# Altium footprint library 13-Pcblib_MCU.PcbLib: 48 footprints (part 2 of 3)
Each footprint in its own frame and in the unit in brackets; x right, y up, seen from the top. Pads: shape width x height; smd on the part's side, far side on the other; paste and mask are expansions set on the pad; w line width, h text height; cw(c..) or ccw(c..) is an arc to the next point about the centre after c.
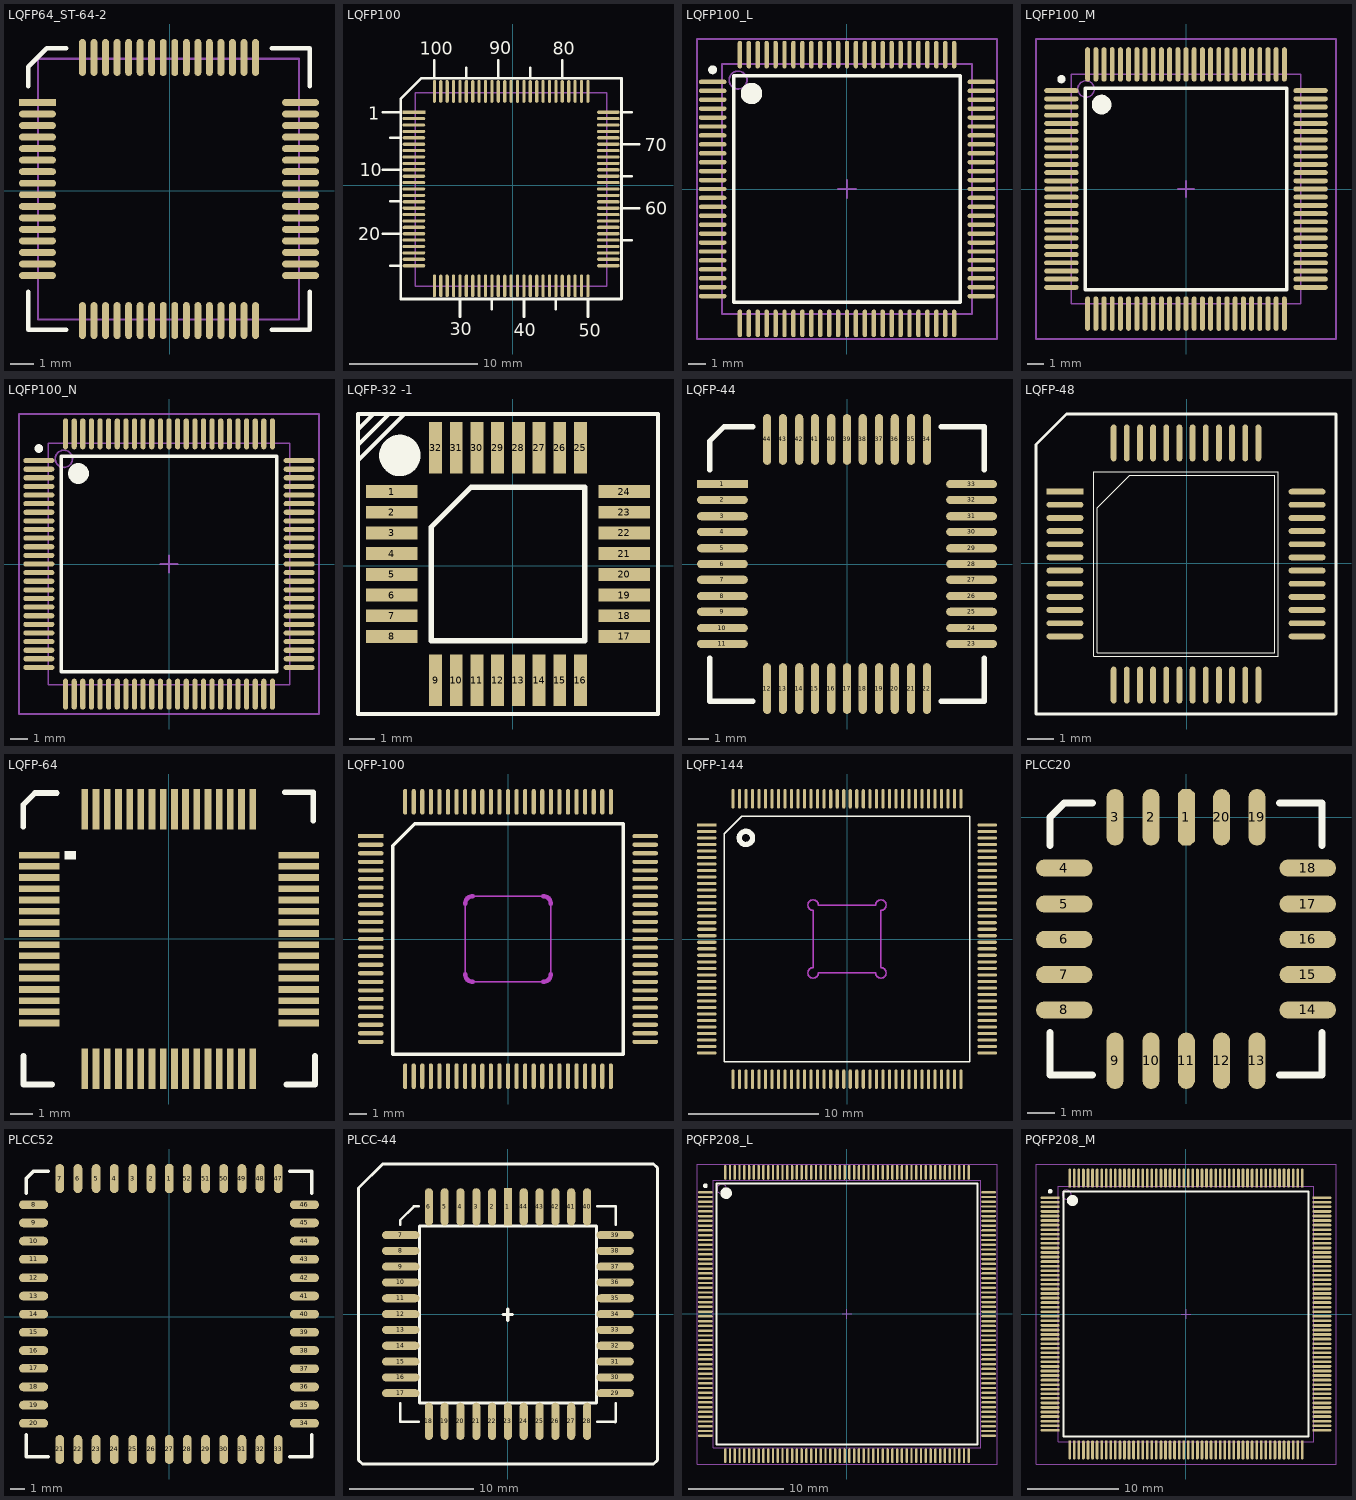
[diagram p1: the footprints below, top view; thin cyan lines are the x and y axes]

## LQFP64_ST-64-2 [mm]
height 1.2
pads (64):
  rect 1.6x0.3 smd: 1(-5.742,3.82)
  oval 1.6x0.3 smd: 2(-5.742,3.32) 3(-5.742,2.82) 4(-5.742,2.32) 5(-5.742,1.82) 6(-5.742,1.32) 7(-5.742,0.82) 8(-5.742,0.32) 9(-5.742,-0.18) 10(-5.742,-0.68) 11(-5.742,-1.18) 12(-5.742,-1.68) 13(-5.742,-2.18) 14(-5.742,-2.68) 15(-5.742,-3.18) 16(-5.742,-3.68) 33(5.658,-3.68) 34(5.658,-3.18) 35(5.658,-2.68) 36(5.658,-2.18) 37(5.658,-1.68) 38(5.658,-1.18) 39(5.658,-0.68) 40(5.658,-0.18) 41(5.658,0.32) 42(5.658,0.82) 43(5.658,1.32) 44(5.658,1.82) 45(5.658,2.32) 46(5.658,2.82) 47(5.658,3.32) 48(5.658,3.82)
  oval 0.3x1.6 smd: 17(-3.792,-5.63) 18(-3.292,-5.63) 19(-2.792,-5.63) 20(-2.292,-5.63) 21(-1.792,-5.63) 22(-1.292,-5.63) 23(-0.792,-5.63) 24(-0.292,-5.63) 25(0.208,-5.63) 26(0.708,-5.63) 27(1.208,-5.63) 28(1.708,-5.63) 29(2.208,-5.63) 30(2.708,-5.63) 31(3.208,-5.63) 32(3.708,-5.63) 49(3.708,5.77) 50(3.208,5.77) 51(2.708,5.77) 52(2.208,5.77) 53(1.708,5.77) 54(1.208,5.77) 55(0.708,5.77) 56(0.208,5.77) 57(-0.292,5.77) 58(-0.792,5.77) 59(-1.292,5.77) 60(-1.792,5.77) 61(-2.292,5.77) 62(-2.792,5.77) 63(-3.292,5.77) 64(-3.792,5.77)
Top Overlay:
  lines w0.2: -6.142,-4.38 -6.142,-6.03 -4.492,-6.03 ; -6.142,4.52 -6.142,5.37 -5.342,6.17 -4.492,6.17 ; 4.408,-6.03 6.058,-6.03 6.058,-4.38 ; 4.408,6.17 6.058,6.17 6.058,4.52
Mechanical 13:
  lines w0.1: -5.715,-5.588 -5.715,5.715 5.588,5.715 5.588,-5.588 -5.715,-5.588
3D body: height 1.2, standoff 0.09, extent -5.715,-5.588 5.588,5.715

## LQFP100 [mm]
height 1.2
pads (100):
  rect 1.778x0.25 smd: 1(-7.722,5.715)
  oval 1.778x0.25 smd: 2(-7.722,5.215) 3(-7.722,4.715) 4(-7.722,4.215) 5(-7.722,3.715) 6(-7.722,3.215) 7(-7.722,2.715) 8(-7.722,2.215) 9(-7.722,1.715) 10(-7.722,1.215) 11(-7.722,0.715) 12(-7.722,0.215) 13(-7.722,-0.285) 14(-7.722,-0.785) 15(-7.722,-1.285) 16(-7.722,-1.785) 17(-7.722,-2.285) 18(-7.722,-2.785) 19(-7.722,-3.285) 20(-7.722,-3.785) 21(-7.722,-4.285) 22(-7.722,-4.785) 23(-7.722,-5.285) 24(-7.722,-5.785) 25(-7.722,-6.285) 51(7.482,-6.285) 52(7.482,-5.785) 53(7.482,-5.285) 54(7.482,-4.785) 55(7.482,-4.285) 56(7.482,-3.785) 57(7.482,-3.285) 58(7.482,-2.785) 59(7.482,-2.285) 60(7.482,-1.785) 61(7.482,-1.285) 62(7.482,-0.785) 63(7.482,-0.285) 64(7.482,0.215) 65(7.482,0.715) 66(7.482,1.215) 67(7.482,1.715) 68(7.482,2.215) 69(7.482,2.715) 70(7.482,3.215) 71(7.482,3.715) 72(7.482,4.215) 73(7.482,4.715) 74(7.482,5.215) 75(7.482,5.715)
  oval 0.25x1.778 smd: 26(-6.12,-7.861) 27(-5.62,-7.861) 28(-5.12,-7.861) 29(-4.62,-7.861) 30(-4.12,-7.861) 31(-3.62,-7.861) 32(-3.12,-7.861) 33(-2.62,-7.861) 34(-2.12,-7.861) 35(-1.62,-7.861) 36(-1.12,-7.861) 37(-0.62,-7.861) 38(-0.12,-7.861) 39(0.38,-7.861) 40(0.88,-7.861) 41(1.38,-7.861) 42(1.88,-7.861) 43(2.38,-7.861) 44(2.88,-7.861) 45(3.38,-7.861) 46(3.88,-7.861) 47(4.38,-7.861) 48(4.88,-7.861) 49(5.38,-7.861) 50(5.88,-7.861) 76(5.88,7.342) 77(5.38,7.342) 78(4.88,7.342) 79(4.38,7.342) 80(3.88,7.342) 81(3.38,7.342) 82(2.88,7.342) 83(2.38,7.342) 84(1.88,7.342) 85(1.38,7.342) 86(0.88,7.342) 87(0.38,7.342) 88(-0.12,7.342) 89(-0.62,7.342) 90(-1.12,7.342) 91(-1.62,7.342) 92(-2.12,7.342) 93(-2.62,7.342) 94(-3.12,7.342) 95(-3.62,7.342) 96(-4.12,7.342) 97(-4.62,7.342) 98(-5.12,7.342) 99(-5.62,7.342) 100(-6.12,7.342)
Top Overlay:
  lines w0.203: -10.16,-3.785 -8.763,-3.785 ; -10.16,1.219 -8.763,1.219 ; -10.16,5.715 -8.763,5.715 ; -9.55,-6.274 -8.763,-6.274 ; -9.55,-1.245 -8.763,-1.245 ; -9.55,3.734 -8.763,3.734 ; -6.121,8.382 -6.121,9.779 ; -4.115,-10.287 -4.115,-8.89 ; -3.632,8.382 -3.632,9.169 ; -1.626,-9.677 -1.626,-8.89 ; -1.118,8.382 -1.118,9.779 ; 0.889,-10.287 0.889,-8.89 ; 1.372,8.382 1.372,9.169 ; 3.378,-9.677 3.378,-8.89 ; 3.886,8.382 3.886,9.779 ; 5.893,-10.287 5.893,-8.89 ; 8.509,-4.293 9.296,-4.293 ; 8.509,-1.803 9.906,-1.803 ; 8.509,0.711 9.296,0.711 ; 8.509,3.2 9.906,3.2 ; 8.509,5.715 9.296,5.715 ; -8.763,-8.89 -8.763,6.096 -8.763,6.731 -7.112,8.382 8.509,8.382 8.509,-8.89 -8.763,-8.89
  text "100" at -7.264,10.211 h1
  text "90" at -1.829,10.262 h1
  text "80" at 3.124,10.211 h1
  text "70" at 10.312,2.667 h1
  text "60" at 10.363,-2.311 h1
  text "50" at 5.156,-11.836 h1
  text "40" at 0.076,-11.786 h1
  text "30" at -4.928,-11.709 h1
  text "20" at -12.09,-4.293 h1
  text "10" at -11.938,0.711 h1
  text "1" at -11.303,5.131 h1
Mechanical 13:
  lines w0.1: -7.62,-7.874 7.366,-7.874 7.366,7.239 -7.62,7.239 -7.62,-7.874
3D body: height 1.61, standoff -0.01, extent -8.127,-8.33 7.873,7.67

## LQFP100_L [mm] "Thin QFP, 100-Leads, Body 14x14mm, Pitch 0.5mm, IPC High Density"
height 1.6
pads (100):
  oval 1.55x0.25 smd: 1(-7.525,6) 2(-7.525,5.5) 3(-7.525,5) 4(-7.525,4.5) 5(-7.525,4) 6(-7.525,3.5) 7(-7.525,3) 8(-7.525,2.5) 9(-7.525,2) 10(-7.525,1.5) 11(-7.525,1) 12(-7.525,0.5) 13(-7.525,0) 14(-7.525,-0.5) 15(-7.525,-1) 16(-7.525,-1.5) 17(-7.525,-2) 18(-7.525,-2.5) 19(-7.525,-3) 20(-7.525,-3.5) 21(-7.525,-4) 22(-7.525,-4.5) 23(-7.525,-5) 24(-7.525,-5.5) 25(-7.525,-6) 51(7.525,-6) 52(7.525,-5.5) 53(7.525,-5) 54(7.525,-4.5) 55(7.525,-4) 56(7.525,-3.5) 57(7.525,-3) 58(7.525,-2.5) 59(7.525,-2) 60(7.525,-1.5) 61(7.525,-1) 62(7.525,-0.5) 63(7.525,0) 64(7.525,0.5) 65(7.525,1) 66(7.525,1.5) 67(7.525,2) 68(7.525,2.5) 69(7.525,3) 70(7.525,3.5) 71(7.525,4) 72(7.525,4.5) 73(7.525,5) 74(7.525,5.5) 75(7.525,6)
  oval 0.25x1.55 smd: 26(-6,-7.525) 27(-5.5,-7.525) 28(-5,-7.525) 29(-4.5,-7.525) 30(-4,-7.525) 31(-3.5,-7.525) 32(-3,-7.525) 33(-2.5,-7.525) 34(-2,-7.525) 35(-1.5,-7.525) 36(-1,-7.525) 37(-0.5,-7.525) 38(0,-7.525) 39(0.5,-7.525) 40(1,-7.525) 41(1.5,-7.525) 42(2,-7.525) 43(2.5,-7.525) 44(3,-7.525) 45(3.5,-7.525) 46(4,-7.525) 47(4.5,-7.525) 48(5,-7.525) 49(5.5,-7.525) 50(6,-7.525) 76(6,7.525) 77(5.5,7.525) 78(5,7.525) 79(4.5,7.525) 80(4,7.525) 81(3.5,7.525) 82(3,7.525) 83(2.5,7.525) 84(2,7.525) 85(1.5,7.525) 86(1,7.525) 87(0.5,7.525) 88(0,7.525) 89(-0.5,7.525) 90(-1,7.525) 91(-1.5,7.525) 92(-2,7.525) 93(-2.5,7.525) 94(-3,7.525) 95(-3.5,7.525) 96(-4,7.525) 97(-4.5,7.525) 98(-5,7.525) 99(-5.5,7.525) 100(-6,7.525)
Top Overlay:
  circle w0.25: c-7.525,6.675 r0.125
  circle w0.6: c-5.35,5.35 r0.3
  lines w0.2: -6.35,-6.35 -6.35,6.35 6.35,6.35 6.35,-6.35 -6.35,-6.35
Mechanical 13:
  circle w0.1: c-6.1,6.1 r0.5
  lines w0.1: -7,-7 -7,7 7,7 7,-7 -7,-7
Mechanical 15:
  lines w0.1: -0.5,0 0.5,0 ; 0,-0.5 0,0.5 ; -8.4,-8.4 -8.4,8.4 8.4,8.4 8.4,-8.4 -8.4,-8.4
3D body: height 1.6, standoff 0, extent -7,-7 7,7

## LQFP100_M [mm] "Thin QFP, 100-Leads, Body 14x14mm, Pitch 0.5mm, IPC Low Density"
height 1.6
pads (100):
  oval 2.1x0.3 smd: 1(-7.6,6) 2(-7.6,5.5) 3(-7.6,5) 4(-7.6,4.5) 5(-7.6,4) 6(-7.6,3.5) 7(-7.6,3) 8(-7.6,2.5) 9(-7.6,2) 10(-7.6,1.5) 11(-7.6,1) 12(-7.6,0.5) 13(-7.6,0) 14(-7.6,-0.5) 15(-7.6,-1) 16(-7.6,-1.5) 17(-7.6,-2) 18(-7.6,-2.5) 19(-7.6,-3) 20(-7.6,-3.5) 21(-7.6,-4) 22(-7.6,-4.5) 23(-7.6,-5) 24(-7.6,-5.5) 25(-7.6,-6) 51(7.6,-6) 52(7.6,-5.5) 53(7.6,-5) 54(7.6,-4.5) 55(7.6,-4) 56(7.6,-3.5) 57(7.6,-3) 58(7.6,-2.5) 59(7.6,-2) 60(7.6,-1.5) 61(7.6,-1) 62(7.6,-0.5) 63(7.6,0) 64(7.6,0.5) 65(7.6,1) 66(7.6,1.5) 67(7.6,2) 68(7.6,2.5) 69(7.6,3) 70(7.6,3.5) 71(7.6,4) 72(7.6,4.5) 73(7.6,5) 74(7.6,5.5) 75(7.6,6)
  oval 0.3x2.1 smd: 26(-6,-7.6) 27(-5.5,-7.6) 28(-5,-7.6) 29(-4.5,-7.6) 30(-4,-7.6) 31(-3.5,-7.6) 32(-3,-7.6) 33(-2.5,-7.6) 34(-2,-7.6) 35(-1.5,-7.6) 36(-1,-7.6) 37(-0.5,-7.6) 38(0,-7.6) 39(0.5,-7.6) 40(1,-7.6) 41(1.5,-7.6) 42(2,-7.6) 43(2.5,-7.6) 44(3,-7.6) 45(3.5,-7.6) 46(4,-7.6) 47(4.5,-7.6) 48(5,-7.6) 49(5.5,-7.6) 50(6,-7.6) 76(6,7.6) 77(5.5,7.6) 78(5,7.6) 79(4.5,7.6) 80(4,7.6) 81(3.5,7.6) 82(3,7.6) 83(2.5,7.6) 84(2,7.6) 85(1.5,7.6) 86(1,7.6) 87(0.5,7.6) 88(0,7.6) 89(-0.5,7.6) 90(-1,7.6) 91(-1.5,7.6) 92(-2,7.6) 93(-2.5,7.6) 94(-3,7.6) 95(-3.5,7.6) 96(-4,7.6) 97(-4.5,7.6) 98(-5,7.6) 99(-5.5,7.6) 100(-6,7.6)
Top Overlay:
  circle w0.25: c-7.6,6.7 r0.125
  circle w0.6: c-5.15,5.15 r0.3
  lines w0.2: -6.15,-6.15 -6.15,6.15 6.15,6.15 6.15,-6.15 -6.15,-6.15
Mechanical 13:
  circle w0.1: c-6.1,6.1 r0.5
  lines w0.1: -7,-7 -7,7 7,7 7,-7 -7,-7
Mechanical 15:
  lines w0.1: -0.5,0 0.5,0 ; 0,-0.5 0,0.5 ; -9.15,-9.15 -9.15,9.15 9.15,9.15 9.15,-9.15 -9.15,-9.15
3D body: height 1.6, standoff 0, extent -7,-7 7,7

## LQFP100_N [mm] "Thin QFP, 100-Leads, Body 14x14mm, Pitch 0.5mm, IPC Medium Density"
height 1.6
pads (100):
  oval 1.8x0.3 smd: 1(-7.55,6) 2(-7.55,5.5) 3(-7.55,5) 4(-7.55,4.5) 5(-7.55,4) 6(-7.55,3.5) 7(-7.55,3) 8(-7.55,2.5) 9(-7.55,2) 10(-7.55,1.5) 11(-7.55,1) 12(-7.55,0.5) 13(-7.55,0) 14(-7.55,-0.5) 15(-7.55,-1) 16(-7.55,-1.5) 17(-7.55,-2) 18(-7.55,-2.5) 19(-7.55,-3) 20(-7.55,-3.5) 21(-7.55,-4) 22(-7.55,-4.5) 23(-7.55,-5) 24(-7.55,-5.5) 25(-7.55,-6) 51(7.55,-6) 52(7.55,-5.5) 53(7.55,-5) 54(7.55,-4.5) 55(7.55,-4) 56(7.55,-3.5) 57(7.55,-3) 58(7.55,-2.5) 59(7.55,-2) 60(7.55,-1.5) 61(7.55,-1) 62(7.55,-0.5) 63(7.55,0) 64(7.55,0.5) 65(7.55,1) 66(7.55,1.5) 67(7.55,2) 68(7.55,2.5) 69(7.55,3) 70(7.55,3.5) 71(7.55,4) 72(7.55,4.5) 73(7.55,5) 74(7.55,5.5) 75(7.55,6)
  oval 0.3x1.8 smd: 26(-6,-7.55) 27(-5.5,-7.55) 28(-5,-7.55) 29(-4.5,-7.55) 30(-4,-7.55) 31(-3.5,-7.55) 32(-3,-7.55) 33(-2.5,-7.55) 34(-2,-7.55) 35(-1.5,-7.55) 36(-1,-7.55) 37(-0.5,-7.55) 38(0,-7.55) 39(0.5,-7.55) 40(1,-7.55) 41(1.5,-7.55) 42(2,-7.55) 43(2.5,-7.55) 44(3,-7.55) 45(3.5,-7.55) 46(4,-7.55) 47(4.5,-7.55) 48(5,-7.55) 49(5.5,-7.55) 50(6,-7.55) 76(6,7.55) 77(5.5,7.55) 78(5,7.55) 79(4.5,7.55) 80(4,7.55) 81(3.5,7.55) 82(3,7.55) 83(2.5,7.55) 84(2,7.55) 85(1.5,7.55) 86(1,7.55) 87(0.5,7.55) 88(0,7.55) 89(-0.5,7.55) 90(-1,7.55) 91(-1.5,7.55) 92(-2,7.55) 93(-2.5,7.55) 94(-3,7.55) 95(-3.5,7.55) 96(-4,7.55) 97(-4.5,7.55) 98(-5,7.55) 99(-5.5,7.55) 100(-6,7.55)
Top Overlay:
  circle w0.25: c-7.55,6.7 r0.125
  circle w0.6: c-5.25,5.25 r0.3
  lines w0.2: -6.25,-6.25 -6.25,6.25 6.25,6.25 6.25,-6.25 -6.25,-6.25
Mechanical 13:
  circle w0.1: c-6.1,6.1 r0.5
  lines w0.1: -7,-7 -7,7 7,7 7,-7 -7,-7
Mechanical 15:
  lines w0.1: -0.5,0 0.5,0 ; 0,-0.5 0,0.5 ; -8.7,-8.7 -8.7,8.7 8.7,8.7 8.7,-8.7 -8.7,-8.7
3D body: height 1.6, standoff 0, extent -7,-7 7,7

## LQFP-32 -1 [mm]
pads (32):
  rect 2x0.5 smd: 1(-4.689,2.869) 2(-4.689,2.069) 3(-4.689,1.269) 4(-4.689,0.469) 5(-4.689,-0.331) 6(-4.689,-1.131) 7(-4.689,-1.931) 8(-4.689,-2.731) 17(4.311,-2.731) 18(4.311,-1.931) 19(4.311,-1.131) 20(4.311,-0.331) 21(4.311,0.469) 22(4.311,1.269) 23(4.311,2.069) 24(4.311,2.869)
  rect 0.5x2 smd: 9(-2.989,-4.431) 10(-2.189,-4.431) 11(-1.389,-4.431) 12(-0.589,-4.431) 13(0.211,-4.431) 14(1.011,-4.431) 15(1.811,-4.431) 16(2.611,-4.431) 25(2.611,4.569) 26(1.811,4.569) 27(1.011,4.569) 28(0.211,4.569) 29(-0.589,4.569) 30(-1.389,4.569) 31(-2.189,4.569) 32(-2.989,4.569)
Top Overlay:
  circle w1: c-4.369,4.267 r0.3
  lines w0.17: -5.989,4.069 -4.189,5.869 ; -5.989,4.669 -4.789,5.869 ; -5.989,5.269 -5.389,5.869 ; -5.989,-5.731 5.611,-5.731 5.611,5.869 -5.989,5.869 -5.989,-5.731
  lines w0.2: -3.154,-2.896 -3.154,1.499 -1.619,3.034 2.776,3.034 2.776,-2.896 -3.154,-2.896
3D body: height 1.6, standoff -0.05, extent -4.699,-4.424 4.301,4.576

## LQFP-44 [mil]
pads (44):
  rect 100x16 smd: 1(-245,157)
  oval 100x16 smd: 2(-245,126) 3(-245,94) 4(-245,63) 5(-245,31) 6(-245,0) 7(-245,-31) 8(-245,-63) 9(-245,-94) 10(-245,-126) 11(-245,-157) 23(245,-157) 24(245,-126) 25(245,-94) 26(245,-63) 27(245,-31) 28(245,0) 29(245,31) 30(245,63) 31(245,94) 32(245,126) 33(245,157)
  oval 16x100 smd: 12(-157,-245) 13(-126,-245) 14(-94,-245) 15(-63,-245) 16(-31,-245) 17(0,-245) 18(31,-245) 19(63,-245) 20(94,-245) 21(126,-245) 22(157,-245) 34(157,245) 35(126,245) 36(94,245) 37(63,245) 38(31,245) 39(0,245) 40(-31,245) 41(-63,245) 42(-94,245) 43(-126,245) 44(-157,245)
Top Overlay:
  lines w10: -270,-185 -270,-270 -185,-270 ; -270,185 -270,242 -242,270 -185,270 ; 185,-270 270,-270 270,-185 ; 185,270 270,270 270,185
3D body: height 43.31, standoff -0.39, extent -237.22,-236.22 235.22,236.22

## LQFP-48 [mm]
height 1
pads (48):
  rect 1.4x0.22 smd: 1(-4.625,2.725)
  oval 1.4x0.22 smd: 2(-4.625,2.225) 3(-4.625,1.725) 4(-4.625,1.225) 5(-4.625,0.725) 6(-4.625,0.225) 7(-4.625,-0.275) 8(-4.625,-0.775) 9(-4.625,-1.275) 10(-4.625,-1.775) 11(-4.625,-2.275) 12(-4.625,-2.775) 25(4.575,-2.775) 26(4.575,-2.275) 27(4.575,-1.775) 28(4.575,-1.275) 29(4.575,-0.775) 30(4.575,-0.275) 31(4.575,0.225) 32(4.575,0.725) 33(4.575,1.225) 34(4.575,1.725) 35(4.575,2.225) 36(4.575,2.725)
  oval 0.22x1.4 smd: 13(-2.775,-4.625) 14(-2.275,-4.625) 15(-1.775,-4.625) 16(-1.275,-4.625) 17(-0.775,-4.625) 18(-0.275,-4.625) 19(0.225,-4.625) 20(0.725,-4.625) 21(1.225,-4.625) 22(1.725,-4.625) 23(2.225,-4.625) 24(2.725,-4.625) 37(2.725,4.575) 38(2.225,4.575) 39(1.725,4.575) 40(1.225,4.575) 41(0.725,4.575) 42(0.225,4.575) 43(-0.275,4.575) 44(-0.775,4.575) 45(-1.275,4.575) 46(-1.775,4.575) 47(-2.275,4.575) 48(-2.775,4.575)
Top Overlay:
  lines w0.025: -3.525,-3.525 3.475,-3.525 3.475,3.475 -3.525,3.475 -3.525,3.4 -3.525,-0.025 -3.525,-3.525 ; -3.39,-3.39 -3.39,2.105 -2.155,3.34 3.34,3.34 3.34,-3.39 -3.39,-3.39
  lines w0.102: -5.725,-5.725 5.675,-5.725 5.675,5.675 -4.561,5.675 -5.725,4.511 -5.725,-5.725
3D body: height 1.45, standoff 0, extent -4.525,-4.53 4.475,4.47

## LQFP-64 [mm]
pads (64):
  rect 1.8x0.3 smd: 1(-5.8,3.746) 2(-5.8,3.246) 3(-5.8,2.746) 4(-5.8,2.246) 5(-5.8,1.746) 6(-5.8,1.246) 7(-5.8,0.746) 8(-5.8,0.246) 9(-5.8,-0.254) 10(-5.8,-0.754) 11(-5.8,-1.254) 12(-5.8,-1.754) 13(-5.8,-2.254) 14(-5.8,-2.754) 15(-5.8,-3.254) 16(-5.8,-3.754) 33(5.8,-3.754) 34(5.8,-3.254) 35(5.8,-2.754) 36(5.8,-2.254) 37(5.8,-1.754) 38(5.8,-1.254) 39(5.8,-0.754) 40(5.8,-0.254) 41(5.8,0.246) 42(5.8,0.746) 43(5.8,1.246) 44(5.8,1.746) 45(5.8,2.246) 46(5.8,2.746) 47(5.8,3.246) 48(5.8,3.746)
  rect 0.3x1.8 smd: 17(-3.759,-5.8) 18(-3.259,-5.8) 19(-2.759,-5.8) 20(-2.259,-5.8) 21(-1.759,-5.8) 22(-1.259,-5.8) 23(-0.759,-5.8) 24(-0.259,-5.8) 25(0.241,-5.8) 26(0.741,-5.8) 27(1.241,-5.8) 28(1.741,-5.8) 29(2.241,-5.8) 30(2.741,-5.8) 31(3.241,-5.8) 32(3.741,-5.8) 49(3.741,5.8) 50(3.241,5.8) 51(2.741,5.8) 52(2.241,5.8) 53(1.741,5.8) 54(1.241,5.8) 55(0.741,5.8) 56(0.241,5.8) 57(-0.259,5.8) 58(-0.759,5.8) 59(-1.259,5.8) 60(-1.759,5.8) 61(-2.259,5.8) 62(-2.759,5.8) 63(-3.259,5.8) 64(-3.759,5.8)
Top Overlay:
  rectangle: -4.658,3.55 -4.151,3.931
  lines w0.254: -6.517,5.017 -6.517,5.992 -5.984,6.525 -5.009,6.525 ; -6.502,-5.225 -6.502,-6.5 -5.227,-6.5 ; 5.166,6.553 6.441,6.553 6.441,5.278 ; 5.248,-6.5 6.523,-6.5 6.523,-5.225
3D body: height 1.58, standoff 0, extent -6.535,-6.53 6.515,6.521

## LQFP-100 [mm]
pads (100):
  rect 1.5x0.24 smd: 1(-8,6)
  oval 1.5x0.24 smd: 2(-8,5.5) 3(-8,5) 4(-8,4.5) 5(-8,4) 6(-8,3.5) 7(-8,3) 8(-8,2.5) 9(-8,2) 10(-8,1.5) 11(-8,1) 12(-8,0.5) 13(-8,0) 14(-8,-0.5) 15(-8,-1) 16(-8,-1.5) 17(-8,-2) 18(-8,-2.5) 19(-8,-3) 20(-8,-3.5) 21(-8,-4) 22(-8,-4.5) 23(-8,-5) 24(-8,-5.5) 25(-8,-6) 51(8,-6) 52(8,-5.5) 53(8,-5) 54(8,-4.5) 55(8,-4) 56(8,-3.5) 57(8,-3) 58(8,-2.5) 59(8,-2) 60(8,-1.5) 61(8,-1) 62(8,-0.5) 63(8,0) 64(8,0.5) 65(8,1) 66(8,1.5) 67(8,2) 68(8,2.5) 69(8,3) 70(8,3.5) 71(8,4) 72(8,4.5) 73(8,5) 74(8,5.5) 75(8,6)
  oval 0.24x1.5 smd: 26(-6,-8) 27(-5.5,-8) 28(-5,-8) 29(-4.5,-8) 30(-4,-8) 31(-3.5,-8) 32(-3,-8) 33(-2.5,-8) 34(-2,-8) 35(-1.5,-8) 36(-1,-8) 37(-0.5,-8) 38(0,-8) 39(0.5,-8) 40(1,-8) 41(1.5,-8) 42(2,-8) 43(2.5,-8) 44(3,-8) 45(3.5,-8) 46(4,-8) 47(4.5,-8) 48(5,-8) 49(5.5,-8) 50(6,-8) 76(6,8) 77(5.5,8) 78(5,8) 79(4.5,8) 80(4,8) 81(3.5,8) 82(3,8) 83(2.5,8) 84(2,8) 85(1.5,8) 86(1,8) 87(0.5,8) 88(0,8) 89(-0.5,8) 90(-1,8) 91(-1.5,8) 92(-2,8) 93(-2.5,8) 94(-3,8) 95(-3.5,8) 96(-4,8) 97(-4.5,8) 98(-5,8) 99(-5.5,8) 100(-6,8)
Top Overlay:
  lines w0.2: -6.715,-6.715 -6.715,5.43 -5.43,6.715 6.715,6.715 6.715,-6.715 -6.715,-6.715
Keep-Out Layer:
  lines w0.1: -2.5,-2.05 -2.5,2.05 ; -2.05,-2.5 2.05,-2.5 ; -2.05,2.5 2.05,2.5 ; 2.5,-2.05 2.5,2.05
  lines w0.254: -2.5,-2.05 ccw(c-2.05,-2.05) -2.05,-2.5 ; -2.5,2.05 cw(c-2.05,2.05) -2.05,2.5 ; 2.05,-2.5 ccw(c2.05,-2.05) 2.5,-2.05 ; 2.05,2.5 cw(c2.05,2.05) 2.5,2.05
Mechanical 1:
  lines w0.1: -2.5,-2.05 -2.5,2.05 ; -2.05,-2.5 2.05,-2.5 ; -2.05,2.5 2.05,2.5 ; 2.5,-2.05 2.5,2.05
  lines w0.254: -2.5,-2.05 ccw(c-2.05,-2.05) -2.05,-2.5 ; -2.5,2.05 cw(c-2.05,2.05) -2.05,2.5 ; 2.05,-2.5 ccw(c2.05,-2.05) 2.5,-2.05 ; 2.05,2.5 cw(c2.05,2.05) 2.5,2.05
3D body: height 1.61, standoff -0.01, extent -8,-7.993 8,8.007

## LQFP-144 [mm]
pads (144):
  rect 1.5x0.24 smd: 1(-10.75,8.75)
  oval 1.5x0.24 smd: 2(-10.75,8.25) 3(-10.75,7.75) 4(-10.75,7.25) 5(-10.75,6.75) 6(-10.75,6.25) 7(-10.75,5.75) 8(-10.75,5.25) 9(-10.75,4.75) 10(-10.75,4.25) 11(-10.75,3.75) 12(-10.75,3.25) 13(-10.75,2.75) 14(-10.75,2.25) 15(-10.75,1.75) 16(-10.75,1.25) 17(-10.75,0.75) 18(-10.75,0.25) 19(-10.75,-0.25) 20(-10.75,-0.75) 21(-10.75,-1.25) 22(-10.75,-1.75) 23(-10.75,-2.25) 24(-10.75,-2.75) 25(-10.75,-3.25) 26(-10.75,-3.75) 27(-10.75,-4.25) 28(-10.75,-4.75) 29(-10.75,-5.25) 30(-10.75,-5.75) 31(-10.75,-6.25) 32(-10.75,-6.75) 33(-10.75,-7.25) 34(-10.75,-7.75) 35(-10.75,-8.25) 36(-10.75,-8.75) 73(10.75,-8.75) 74(10.75,-8.25) 75(10.75,-7.75) 76(10.75,-7.25) 77(10.75,-6.75) 78(10.75,-6.25) 79(10.75,-5.75) 80(10.75,-5.25) 81(10.75,-4.75) 82(10.75,-4.25) 83(10.75,-3.75) 84(10.75,-3.25) 85(10.75,-2.75) 86(10.75,-2.25) 87(10.75,-1.75) 88(10.75,-1.25) 89(10.75,-0.75) 90(10.75,-0.25) 91(10.75,0.25) 92(10.75,0.75) 93(10.75,1.25) 94(10.75,1.75) 95(10.75,2.25) 96(10.75,2.75) 97(10.75,3.25) 98(10.75,3.75) 99(10.75,4.25) 100(10.75,4.75) 101(10.75,5.25) 102(10.75,5.75) 103(10.75,6.25) 104(10.75,6.75) 105(10.75,7.25) 106(10.75,7.75) 107(10.75,8.25) 108(10.75,8.75)
  oval 0.24x1.5 smd: 37(-8.75,-10.75) 38(-8.25,-10.75) 39(-7.75,-10.75) 40(-7.25,-10.75) 41(-6.75,-10.75) 42(-6.25,-10.75) 43(-5.75,-10.75) 44(-5.25,-10.75) 45(-4.75,-10.75) 46(-4.25,-10.75) 47(-3.75,-10.75) 48(-3.25,-10.75) 49(-2.75,-10.75) 50(-2.25,-10.75) 51(-1.75,-10.75) 52(-1.25,-10.75) 53(-0.75,-10.75) 54(-0.25,-10.75) 55(0.25,-10.75) 56(0.75,-10.75) 57(1.25,-10.75) 58(1.75,-10.75) 59(2.25,-10.75) 60(2.75,-10.75) 61(3.25,-10.75) 62(3.75,-10.75) 63(4.25,-10.75) 64(4.75,-10.75) 65(5.25,-10.75) 66(5.75,-10.75) 67(6.25,-10.75) 68(6.75,-10.75) 69(7.25,-10.75) 70(7.75,-10.75) 71(8.25,-10.75) 72(8.75,-10.75) 109(8.75,10.75) 110(8.25,10.75) 111(7.75,10.75) 112(7.25,10.75) 113(6.75,10.75) 114(6.25,10.75) 115(5.75,10.75) 116(5.25,10.75) 117(4.75,10.75) 118(4.25,10.75) 119(3.75,10.75) 120(3.25,10.75) 121(2.75,10.75) 122(2.25,10.75) 123(1.75,10.75) 124(1.25,10.75) 125(0.75,10.75) 126(0.25,10.75) 127(-0.25,10.75) 128(-0.75,10.75) 129(-1.25,10.75) 130(-1.75,10.75) 131(-2.25,10.75) 132(-2.75,10.75) 133(-3.25,10.75) 134(-3.75,10.75) 135(-4.25,10.75) 136(-4.75,10.75) 137(-5.25,10.75) 138(-5.75,10.75) 139(-6.25,10.75) 140(-6.75,10.75) 141(-7.25,10.75) 142(-7.75,10.75) 143(-8.25,10.75) 144(-8.75,10.75)
Top Overlay:
  circle w0.406: c-7.75,7.75 r0.508
  lines w0.1: -9.415,-9.415 -9.415,8.08 -8.08,9.415 9.415,9.415 9.415,-9.415 -9.415,-9.415
Keep-Out Layer:
  lines w0.1: 2.2,-2.6 ccw(c2.6,-2.6) 2.6,-2.2 ; 2.204,-2.6 -2.2,-2.6 cw(c-2.6,-2.6) -2.6,-2.2 -2.6,2.2 cw(c-2.6,2.6) -2.2,2.6 2.2,2.6 cw(c2.6,2.6) 2.6,2.2 2.6,-2.172
Mechanical 1:
  lines w0.1: 2.2,-2.6 ccw(c2.6,-2.6) 2.6,-2.2 ; 2.204,-2.6 -2.2,-2.6 cw(c-2.6,-2.6) -2.6,-2.2 -2.6,2.2 cw(c-2.6,2.6) -2.2,2.6 2.2,2.6 cw(c2.6,2.6) 2.6,2.2 2.6,-2.172

## PLCC20 [mil]
pads (20):
  oct 24x80 smd: 1(0,0)
  oval 24x80 smd: 2(-50,0) 3(-101,0) 9(-101,-345) 10(-50,-345) 11(0,-345) 12(50,-345) 13(100,-345) 19(100,0) 20(50,0)
  oval 80x24 smd: 4(-173,-72) 5(-173,-123) 6(-173,-173) 7(-173,-223) 8(-173,-273) 14(172,-273) 15(172,-223) 16(172,-173) 17(172,-123) 18(172,-72)
Top Overlay:
  lines w10: -193,-305 -193,-365 -133,-365 ; -193,-40 -193,0 -173,20 -133,20 ; 132,-365 192,-365 192,-305 ; 132,20 192,20 192,-40

## PLCC52 [mil]
pads (52):
  oct 24x80 smd: 1(0,380)
  oval 24x80 smd: 2(-50,380) 3(-100,380) 4(-151,380) 5(-201,380) 6(-251,380) 7(-301,380) 21(-301,-365) 22(-251,-365) 23(-201,-365) 24(-151,-365) 25(-100,-365) 26(-50,-365) 27(0,-365) 28(50,-365) 29(100,-365) 30(150,-365) 31(200,-365) 32(250,-365) 33(300,-365) 47(300,380) 48(250,380) 49(200,380) 50(150,380) 51(100,380) 52(50,380)
  oval 80x24 smd: 8(-373,308) 9(-373,258) 10(-373,208) 11(-373,158) 12(-373,107) 13(-373,57) 14(-373,7) 15(-373,-43) 16(-373,-93) 17(-373,-142) 18(-373,-193) 19(-373,-243) 20(-373,-293) 34(372,-293) 35(372,-243) 36(372,-193) 37(372,-143) 38(372,-93) 39(372,-43) 40(372,7) 41(372,57) 42(372,107) 43(372,158) 44(372,208) 45(372,258) 46(372,308)
Top Overlay:
  lines w10: -393,-325 -393,-385 -333,-385 ; -393,340 -393,380 -373,400 -333,400 ; 332,-385 392,-385 392,-325 ; 332,400 392,400 392,340

## PLCC-44 [mm]
pads (44):
  rect 0.65x3 smd: 1(0,8.608)
  oval 0.65x3 smd: 2(-1.27,8.608) 3(-2.54,8.608) 4(-3.81,8.608) 5(-5.08,8.608) 6(-6.35,8.608) 18(-6.35,-8.608) 19(-5.08,-8.608) 20(-3.81,-8.608) 21(-2.54,-8.608) 22(-1.27,-8.608) 23(0,-8.608) 24(1.27,-8.608) 25(2.54,-8.608) 26(3.81,-8.608) 27(5.08,-8.608) 28(6.35,-8.608) 40(6.35,8.608) 41(5.08,8.608) 42(3.81,8.608) 43(2.54,8.608) 44(1.27,8.608)
  oval 3x0.65 smd: 7(-8.608,6.35) 8(-8.608,5.08) 9(-8.608,3.81) 10(-8.608,2.54) 11(-8.608,1.27) 12(-8.608,0) 13(-8.608,-1.27) 14(-8.608,-2.54) 15(-8.608,-3.81) 16(-8.608,-5.08) 17(-8.608,-6.35) 29(8.608,-6.35) 30(8.608,-5.08) 31(8.608,-3.81) 32(8.608,-2.54) 33(8.608,-1.27) 34(8.608,0) 35(8.608,1.27) 36(8.608,2.54) 37(8.608,3.81) 38(8.608,5.08) 39(8.608,6.35)
Top Overlay:
  lines w0.2: -8.65,-7.175 -8.65,-8.65 -7.175,-8.65 ; -8.65,7.175 -8.65,7.55 -7.55,8.65 -7.175,8.65 ; 7.175,-8.65 8.65,-8.65 8.65,-7.175 ; 7.175,8.65 8.65,8.65 8.65,7.175
  lines w0.254: -0.375,-0.038 0.353,-0.038 ; -0.019,-0.513 -0.019,0.402 ; 8.609,-8.65 8.65,-8.65 ; -11.995,-11.72 -11.995,9.108 -11.995,10.124 -10.066,12.053 11.689,12.053 12.005,11.737 12.005,-11.72 11.689,-12.036 -11.679,-12.036 -11.995,-11.72 ; -7.112,-7.144 7.112,-7.144 7.112,7.08 -7.112,7.08 -7.112,-7.144
3D body: height 4.39, standoff 0, extent -8.788,-8.815 8.737,8.71

## PQFP208_L [mm] "Shrink QFP, 208-Leads, Body 28x28mm, Pitch 0.5mm, IPC High Density"
height 4.1
pads (208):
  oval 1.55x0.25 smd: 1(-14.825,12.75) 2(-14.825,12.25) 3(-14.825,11.75) 4(-14.825,11.25) 5(-14.825,10.75) 6(-14.825,10.25) 7(-14.825,9.75) 8(-14.825,9.25) 9(-14.825,8.75) 10(-14.825,8.25) 11(-14.825,7.75) 12(-14.825,7.25) 13(-14.825,6.75) 14(-14.825,6.25) 15(-14.825,5.75) 16(-14.825,5.25) 17(-14.825,4.75) 18(-14.825,4.25) 19(-14.825,3.75) 20(-14.825,3.25) 21(-14.825,2.75) 22(-14.825,2.25) 23(-14.825,1.75) 24(-14.825,1.25) 25(-14.825,0.75) 26(-14.825,0.25) 27(-14.825,-0.25) 28(-14.825,-0.75) 29(-14.825,-1.25) 30(-14.825,-1.75) 31(-14.825,-2.25) 32(-14.825,-2.75) 33(-14.825,-3.25) 34(-14.825,-3.75) 35(-14.825,-4.25) 36(-14.825,-4.75) 37(-14.825,-5.25) 38(-14.825,-5.75) 39(-14.825,-6.25) 40(-14.825,-6.75) 41(-14.825,-7.25) 42(-14.825,-7.75) 43(-14.825,-8.25) 44(-14.825,-8.75) 45(-14.825,-9.25) 46(-14.825,-9.75) 47(-14.825,-10.25) 48(-14.825,-10.75) 49(-14.825,-11.25) 50(-14.825,-11.75) 51(-14.825,-12.25) 52(-14.825,-12.75) 105(14.825,-12.75) 106(14.825,-12.25) 107(14.825,-11.75) 108(14.825,-11.25) 109(14.825,-10.75) 110(14.825,-10.25) 111(14.825,-9.75) 112(14.825,-9.25) 113(14.825,-8.75) 114(14.825,-8.25) 115(14.825,-7.75) 116(14.825,-7.25) 117(14.825,-6.75) 118(14.825,-6.25) 119(14.825,-5.75) 120(14.825,-5.25) 121(14.825,-4.75) 122(14.825,-4.25) 123(14.825,-3.75) 124(14.825,-3.25) 125(14.825,-2.75) 126(14.825,-2.25) 127(14.825,-1.75) 128(14.825,-1.25) 129(14.825,-0.75) 130(14.825,-0.25) 131(14.825,0.25) 132(14.825,0.75) 133(14.825,1.25) 134(14.825,1.75) 135(14.825,2.25) 136(14.825,2.75) 137(14.825,3.25) 138(14.825,3.75) 139(14.825,4.25) 140(14.825,4.75) 141(14.825,5.25) 142(14.825,5.75) 143(14.825,6.25) 144(14.825,6.75) 145(14.825,7.25) 146(14.825,7.75) 147(14.825,8.25) 148(14.825,8.75) 149(14.825,9.25) 150(14.825,9.75) 151(14.825,10.25) 152(14.825,10.75) 153(14.825,11.25) 154(14.825,11.75) 155(14.825,12.25) 156(14.825,12.75)
  oval 0.25x1.55 smd: 53(-12.75,-14.825) 54(-12.25,-14.825) 55(-11.75,-14.825) 56(-11.25,-14.825) 57(-10.75,-14.825) 58(-10.25,-14.825) 59(-9.75,-14.825) 60(-9.25,-14.825) 61(-8.75,-14.825) 62(-8.25,-14.825) 63(-7.75,-14.825) 64(-7.25,-14.825) 65(-6.75,-14.825) 66(-6.25,-14.825) 67(-5.75,-14.825) 68(-5.25,-14.825) 69(-4.75,-14.825) 70(-4.25,-14.825) 71(-3.75,-14.825) 72(-3.25,-14.825) 73(-2.75,-14.825) 74(-2.25,-14.825) 75(-1.75,-14.825) 76(-1.25,-14.825) 77(-0.75,-14.825) 78(-0.25,-14.825) 79(0.25,-14.825) 80(0.75,-14.825) 81(1.25,-14.825) 82(1.75,-14.825) 83(2.25,-14.825) 84(2.75,-14.825) 85(3.25,-14.825) 86(3.75,-14.825) 87(4.25,-14.825) 88(4.75,-14.825) 89(5.25,-14.825) 90(5.75,-14.825) 91(6.25,-14.825) 92(6.75,-14.825) 93(7.25,-14.825) 94(7.75,-14.825) 95(8.25,-14.825) 96(8.75,-14.825) 97(9.25,-14.825) 98(9.75,-14.825) 99(10.25,-14.825) 100(10.75,-14.825) 101(11.25,-14.825) 102(11.75,-14.825) 103(12.25,-14.825) 104(12.75,-14.825) 157(12.75,14.825) 158(12.25,14.825) 159(11.75,14.825) 160(11.25,14.825) 161(10.75,14.825) 162(10.25,14.825) 163(9.75,14.825) 164(9.25,14.825) 165(8.75,14.825) 166(8.25,14.825) 167(7.75,14.825) 168(7.25,14.825) 169(6.75,14.825) 170(6.25,14.825) 171(5.75,14.825) 172(5.25,14.825) 173(4.75,14.825) 174(4.25,14.825) 175(3.75,14.825) 176(3.25,14.825) 177(2.75,14.825) 178(2.25,14.825) 179(1.75,14.825) 180(1.25,14.825) 181(0.75,14.825) 182(0.25,14.825) 183(-0.25,14.825) 184(-0.75,14.825) 185(-1.25,14.825) 186(-1.75,14.825) 187(-2.25,14.825) 188(-2.75,14.825) 189(-3.25,14.825) 190(-3.75,14.825) 191(-4.25,14.825) 192(-4.75,14.825) 193(-5.25,14.825) 194(-5.75,14.825) 195(-6.25,14.825) 196(-6.75,14.825) 197(-7.25,14.825) 198(-7.75,14.825) 199(-8.25,14.825) 200(-8.75,14.825) 201(-9.25,14.825) 202(-9.75,14.825) 203(-10.25,14.825) 204(-10.75,14.825) 205(-11.25,14.825) 206(-11.75,14.825) 207(-12.25,14.825) 208(-12.75,14.825)
Top Overlay:
  circle w0.6: c-12.65,12.65 r0.3
  circle w0.25: c-14.825,13.425 r0.125
  lines w0.2: -13.65,-13.65 13.65,-13.65 13.65,13.65 -13.65,13.65 -13.65,-13.65
Mechanical 13:
  circle w0.1: c-13.1,13.1 r0.5
  lines w0.1: -14,-14 14,-14 14,14 -14,14 -14,-14
Mechanical 15:
  lines w0.1: -0.5,0 0.5,0 ; 0,-0.5 0,0.5 ; -15.7,-15.7 15.7,-15.7 15.7,15.7 -15.7,15.7 -15.7,-15.7
3D body: height 3.5, standoff 0, extent -15.318,-15.269 15.267,15.316

## PQFP208_M [mm] "Shrink QFP, 208-Leads, Body 28x28mm, Pitch 0.5mm, IPC Low Density"
height 4.1
pads (208):
  oval 2.1x0.3 smd: 1(-14.9,12.75) 2(-14.9,12.25) 3(-14.9,11.75) 4(-14.9,11.25) 5(-14.9,10.75) 6(-14.9,10.25) 7(-14.9,9.75) 8(-14.9,9.25) 9(-14.9,8.75) 10(-14.9,8.25) 11(-14.9,7.75) 12(-14.9,7.25) 13(-14.9,6.75) 14(-14.9,6.25) 15(-14.9,5.75) 16(-14.9,5.25) 17(-14.9,4.75) 18(-14.9,4.25) 19(-14.9,3.75) 20(-14.9,3.25) 21(-14.9,2.75) 22(-14.9,2.25) 23(-14.9,1.75) 24(-14.9,1.25) 25(-14.9,0.75) 26(-14.9,0.25) 27(-14.9,-0.25) 28(-14.9,-0.75) 29(-14.9,-1.25) 30(-14.9,-1.75) 31(-14.9,-2.25) 32(-14.9,-2.75) 33(-14.9,-3.25) 34(-14.9,-3.75) 35(-14.9,-4.25) 36(-14.9,-4.75) 37(-14.9,-5.25) 38(-14.9,-5.75) 39(-14.9,-6.25) 40(-14.9,-6.75) 41(-14.9,-7.25) 42(-14.9,-7.75) 43(-14.9,-8.25) 44(-14.9,-8.75) 45(-14.9,-9.25) 46(-14.9,-9.75) 47(-14.9,-10.25) 48(-14.9,-10.75) 49(-14.9,-11.25) 50(-14.9,-11.75) 51(-14.9,-12.25) 52(-14.9,-12.75) 105(14.9,-12.75) 106(14.9,-12.25) 107(14.9,-11.75) 108(14.9,-11.25) 109(14.9,-10.75) 110(14.9,-10.25) 111(14.9,-9.75) 112(14.9,-9.25) 113(14.9,-8.75) 114(14.9,-8.25) 115(14.9,-7.75) 116(14.9,-7.25) 117(14.9,-6.75) 118(14.9,-6.25) 119(14.9,-5.75) 120(14.9,-5.25) 121(14.9,-4.75) 122(14.9,-4.25) 123(14.9,-3.75) 124(14.9,-3.25) 125(14.9,-2.75) 126(14.9,-2.25) 127(14.9,-1.75) 128(14.9,-1.25) 129(14.9,-0.75) 130(14.9,-0.25) 131(14.9,0.25) 132(14.9,0.75) 133(14.9,1.25) 134(14.9,1.75) 135(14.9,2.25) 136(14.9,2.75) 137(14.9,3.25) 138(14.9,3.75) 139(14.9,4.25) 140(14.9,4.75) 141(14.9,5.25) 142(14.9,5.75) 143(14.9,6.25) 144(14.9,6.75) 145(14.9,7.25) 146(14.9,7.75) 147(14.9,8.25) 148(14.9,8.75) 149(14.9,9.25) 150(14.9,9.75) 151(14.9,10.25) 152(14.9,10.75) 153(14.9,11.25) 154(14.9,11.75) 155(14.9,12.25) 156(14.9,12.75)
  oval 0.3x2.1 smd: 53(-12.75,-14.9) 54(-12.25,-14.9) 55(-11.75,-14.9) 56(-11.25,-14.9) 57(-10.75,-14.9) 58(-10.25,-14.9) 59(-9.75,-14.9) 60(-9.25,-14.9) 61(-8.75,-14.9) 62(-8.25,-14.9) 63(-7.75,-14.9) 64(-7.25,-14.9) 65(-6.75,-14.9) 66(-6.25,-14.9) 67(-5.75,-14.9) 68(-5.25,-14.9) 69(-4.75,-14.9) 70(-4.25,-14.9) 71(-3.75,-14.9) 72(-3.25,-14.9) 73(-2.75,-14.9) 74(-2.25,-14.9) 75(-1.75,-14.9) 76(-1.25,-14.9) 77(-0.75,-14.9) 78(-0.25,-14.9) 79(0.25,-14.9) 80(0.75,-14.9) 81(1.25,-14.9) 82(1.75,-14.9) 83(2.25,-14.9) 84(2.75,-14.9) 85(3.25,-14.9) 86(3.75,-14.9) 87(4.25,-14.9) 88(4.75,-14.9) 89(5.25,-14.9) 90(5.75,-14.9) 91(6.25,-14.9) 92(6.75,-14.9) 93(7.25,-14.9) 94(7.75,-14.9) 95(8.25,-14.9) 96(8.75,-14.9) 97(9.25,-14.9) 98(9.75,-14.9) 99(10.25,-14.9) 100(10.75,-14.9) 101(11.25,-14.9) 102(11.75,-14.9) 103(12.25,-14.9) 104(12.75,-14.9) 157(12.75,14.9) 158(12.25,14.9) 159(11.75,14.9) 160(11.25,14.9) 161(10.75,14.9) 162(10.25,14.9) 163(9.75,14.9) 164(9.25,14.9) 165(8.75,14.9) 166(8.25,14.9) 167(7.75,14.9) 168(7.25,14.9) 169(6.75,14.9) 170(6.25,14.9) 171(5.75,14.9) 172(5.25,14.9) 173(4.75,14.9) 174(4.25,14.9) 175(3.75,14.9) 176(3.25,14.9) 177(2.75,14.9) 178(2.25,14.9) 179(1.75,14.9) 180(1.25,14.9) 181(0.75,14.9) 182(0.25,14.9) 183(-0.25,14.9) 184(-0.75,14.9) 185(-1.25,14.9) 186(-1.75,14.9) 187(-2.25,14.9) 188(-2.75,14.9) 189(-3.25,14.9) 190(-3.75,14.9) 191(-4.25,14.9) 192(-4.75,14.9) 193(-5.25,14.9) 194(-5.75,14.9) 195(-6.25,14.9) 196(-6.75,14.9) 197(-7.25,14.9) 198(-7.75,14.9) 199(-8.25,14.9) 200(-8.75,14.9) 201(-9.25,14.9) 202(-9.75,14.9) 203(-10.25,14.9) 204(-10.75,14.9) 205(-11.25,14.9) 206(-11.75,14.9) 207(-12.25,14.9) 208(-12.75,14.9)
Top Overlay:
  circle w0.6: c-12.45,12.45 r0.3
  circle w0.25: c-14.9,13.45 r0.125
  lines w0.2: -13.45,-13.45 13.45,-13.45 13.45,13.45 -13.45,13.45 -13.45,-13.45
Mechanical 13:
  circle w0.1: c-13.1,13.1 r0.5
  lines w0.1: -14,-14 14,-14 14,14 -14,14 -14,-14
Mechanical 15:
  lines w0.1: -0.5,0 0.5,0 ; 0,-0.5 0,0.5 ; -16.45,-16.45 16.45,-16.45 16.45,16.45 -16.45,16.45 -16.45,-16.45
3D body: height 3.5, standoff 0, extent -15.32,-15.318 15.265,15.267